# Altium schematic symbol library jlcpcb_2025_04_capacitors_extended_0805.schlib: 3281 symbols (part 9 of 18) (continued)
## CC0805JRX7R9BB681
designator C?  Capacitance: 680pF  (hidden comment: *)
Capacitor, Ceramic (MLCC), 680pF, ±5%, 50V, X7R, ±5%, SMD 0805; Manufacturer: YAGEO; Manufacturer Part Number: CC0805JRX7R9BB681; Package Size: 0805; JLCPCB Basic Part: No; JLCPCB Part Number: C520014; Supplier 1: LCSC; Category: Capacitors - MLCC; Supplier Part Number 1: C520014; Tolerance: ±5%; Voltage Rating: 50V; Temperature Coefficient: X7R; RoHS: Yes; ComponentLink1Description: Datasheet; ComponentLink1URL: https://wmsc.lcsc.com/wmsc/upload/file/pdf/v2/lcsc/2007231534_YAGEO-CC0805JRX7R9BB681_C520014.pdf; ComponentLink2Description: JLCPCB Part URL; ComponentLink2URL: https://jlcpcb.com/partdetail/C520014; ComponentLink3Description: LCSC Part URL; ComponentLink3URL: https://lcsc.com/product-detail/Multilayer-Ceramic-Capacitors-MLCC---SMD-SMT_YAGEO-YAGEO-CC0805JRX7R9BB681_C520014.html
footprint CAP-0805 (0805 (2012M) Capacitor)
pins: 1, 2

## CC0805JRX7R9BB682
designator C?  Capacitance: 6.8nF  (hidden comment: *)
Capacitor, Ceramic (MLCC), 6.8nF, ±5%, 50V, X7R, ±5%, SMD 0805; Manufacturer: YAGEO; Manufacturer Part Number: CC0805JRX7R9BB682; Package Size: 0805; JLCPCB Basic Part: No; JLCPCB Part Number: C520015; Supplier 1: LCSC; Category: Capacitors - MLCC; Supplier Part Number 1: C520015; Tolerance: ±5%; Voltage Rating: 50V; Temperature Coefficient: X7R; RoHS: Yes; ComponentLink1Description: Datasheet; ComponentLink1URL: https://wmsc.lcsc.com/wmsc/upload/file/pdf/v2/lcsc/2006011836_YAGEO-CC0805JRX7R9BB682_C520015.pdf; ComponentLink2Description: JLCPCB Part URL; ComponentLink2URL: https://jlcpcb.com/partdetail/C520015; ComponentLink3Description: LCSC Part URL; ComponentLink3URL: https://lcsc.com/product-detail/Multilayer-Ceramic-Capacitors-MLCC---SMD-SMT_YAGEO-YAGEO-CC0805JRX7R9BB682_C520015.html
footprint CAP-0805 (0805 (2012M) Capacitor)
pins: 1, 2

## CC0805JRX7R9BB683
designator C?  Capacitance: 68nF  (hidden comment: *)
Capacitor, Ceramic (MLCC), 68nF, ±5%, 50V, X7R, ±5%, SMD 0805; Manufacturer: YAGEO; Manufacturer Part Number: CC0805JRX7R9BB683; Package Size: 0805; JLCPCB Basic Part: No; JLCPCB Part Number: C520046; Supplier 1: LCSC; Category: Capacitors - MLCC; Supplier Part Number 1: C520046; Tolerance: ±5%; Voltage Rating: 50V; Temperature Coefficient: X7R; RoHS: Yes; ComponentLink1Description: Datasheet; ComponentLink1URL: https://wmsc.lcsc.com/wmsc/upload/file/pdf/v2/lcsc/2006011836_YAGEO-CC0805JRX7R9BB683_C520046.pdf; ComponentLink2Description: JLCPCB Part URL; ComponentLink2URL: https://jlcpcb.com/partdetail/C520046; ComponentLink3Description: LCSC Part URL; ComponentLink3URL: https://lcsc.com/product-detail/Multilayer-Ceramic-Capacitors-MLCC---SMD-SMT_YAGEO-YAGEO-CC0805JRX7R9BB683_C520046.html
footprint CAP-0805 (0805 (2012M) Capacitor)
pins: 1, 2

## CC0805JRX7R9BB821
designator C?  Capacitance: 820pF  (hidden comment: *)
Capacitor, Ceramic (MLCC), 820pF, ±5%, 50V, X7R, ±5%, SMD 0805; Manufacturer: YAGEO; Manufacturer Part Number: CC0805JRX7R9BB821; Package Size: 0805; JLCPCB Basic Part: No; JLCPCB Part Number: C520029; Supplier 1: LCSC; Category: Capacitors - MLCC; Supplier Part Number 1: C520029; Tolerance: ±5%; Voltage Rating: 50V; Temperature Coefficient: X7R; RoHS: Yes; ComponentLink1Description: Datasheet; ComponentLink1URL: https://wmsc.lcsc.com/wmsc/upload/file/pdf/v2/lcsc/2007231534_YAGEO-CC0805JRX7R9BB821_C520029.pdf; ComponentLink2Description: JLCPCB Part URL; ComponentLink2URL: https://jlcpcb.com/partdetail/C520029; ComponentLink3Description: LCSC Part URL; ComponentLink3URL: https://lcsc.com/product-detail/Multilayer-Ceramic-Capacitors-MLCC---SMD-SMT_YAGEO-YAGEO-CC0805JRX7R9BB821_C520029.html
footprint CAP-0805 (0805 (2012M) Capacitor)
pins: 1, 2

## CC0805JRX7R9BB822
designator C?  Capacitance: 8.2nF  (hidden comment: *)
Capacitor, Ceramic (MLCC), 8.2nF, ±5%, 50V, X7R, ±5%, SMD 0805; Manufacturer: YAGEO; Manufacturer Part Number: CC0805JRX7R9BB822; Package Size: 0805; JLCPCB Basic Part: No; JLCPCB Part Number: C309490; Supplier 1: LCSC; Category: Capacitors - MLCC; Supplier Part Number 1: C309490; Tolerance: ±5%; Voltage Rating: 50V; Temperature Coefficient: X7R; RoHS: Yes; ComponentLink1Description: Datasheet; ComponentLink1URL: https://wmsc.lcsc.com/wmsc/upload/file/pdf/v2/lcsc/2304140030_YAGEO-CC0805JRX7R9BB822_C309490.pdf; ComponentLink2Description: JLCPCB Part URL; ComponentLink2URL: https://jlcpcb.com/partdetail/C309490; ComponentLink3Description: LCSC Part URL; ComponentLink3URL: https://lcsc.com/product-detail/Multilayer-Ceramic-Capacitors-MLCC---SMD-SMT_YAGEO-YAGEO-CC0805JRX7R9BB822_C309490.html
footprint CAP-0805 (0805 (2012M) Capacitor)
pins: 1, 2

## CC0805JRX7R9BB823
designator C?  Capacitance: 82nF  (hidden comment: *)
Capacitor, Ceramic (MLCC), 82nF, ±5%, 50V, X7R, ±5%, SMD 0805; Manufacturer: YAGEO; Manufacturer Part Number: CC0805JRX7R9BB823; Package Size: 0805; JLCPCB Basic Part: No; JLCPCB Part Number: C520047; Supplier 1: LCSC; Category: Capacitors - MLCC; Supplier Part Number 1: C520047; Tolerance: ±5%; Voltage Rating: 50V; Temperature Coefficient: X7R; RoHS: Yes; ComponentLink1Description: Datasheet; ComponentLink1URL: https://wmsc.lcsc.com/wmsc/upload/file/pdf/v2/lcsc/2005141204_YAGEO-CC0805JRX7R9BB823_C520047.pdf; ComponentLink2Description: JLCPCB Part URL; ComponentLink2URL: https://jlcpcb.com/partdetail/C520047; ComponentLink3Description: LCSC Part URL; ComponentLink3URL: https://lcsc.com/product-detail/Multilayer-Ceramic-Capacitors-MLCC---SMD-SMT_YAGEO-YAGEO-CC0805JRX7R9BB823_C520047.html
footprint CAP-0805 (0805 (2012M) Capacitor)
pins: 1, 2

## CC0805JRX7RABB152
designator C?  Capacitance: 1.5nF  (hidden comment: *)
Capacitor, Ceramic (MLCC), 1.5nF, ±5%, 200V, X7R, ±5%, SMD 0805; Manufacturer: YAGEO; Manufacturer Part Number: CC0805JRX7RABB152; Package Size: 0805; JLCPCB Basic Part: No; JLCPCB Part Number: C1854493; Supplier 1: LCSC; Category: Capacitors - MLCC; Supplier Part Number 1: C1854493; Tolerance: ±5%; Voltage Rating: 200V; Temperature Coefficient: X7R; RoHS: Yes; ComponentLink1Description: Datasheet; ComponentLink1URL: https://wmsc.lcsc.com/wmsc/upload/file/pdf/v2/lcsc/2201271200_YAGEO-CC0805JRX7RABB152_C1854493.pdf; ComponentLink2Description: JLCPCB Part URL; ComponentLink2URL: https://jlcpcb.com/partdetail/C1854493; ComponentLink3Description: LCSC Part URL; ComponentLink3URL: https://lcsc.com/product-detail/Multilayer-Ceramic-Capacitors-MLCC---SMD-SMT_YAGEO-YAGEO-CC0805JRX7RABB152_C1854493.html
footprint CAP-0805 (0805 (2012M) Capacitor)
pins: 1, 2

## CC0805JRX7RABB221
designator C?  Capacitance: 220pF  (hidden comment: *)
Capacitor, Ceramic (MLCC), 220pF, ±5%, 200V, X7R, ±5%, SMD 0805; Manufacturer: YAGEO; Manufacturer Part Number: CC0805JRX7RABB221; Package Size: 0805; JLCPCB Basic Part: No; JLCPCB Part Number: C527220; Supplier 1: LCSC; Category: Capacitors - MLCC; Supplier Part Number 1: C527220; Tolerance: ±5%; Voltage Rating: 200V; Temperature Coefficient: X7R; RoHS: Yes; ComponentLink1Description: Datasheet; ComponentLink1URL: https://wmsc.lcsc.com/wmsc/upload/file/pdf/v2/lcsc/2005261832_YAGEO-CC0805JRX7RABB221_C527220.pdf; ComponentLink2Description: JLCPCB Part URL; ComponentLink2URL: https://jlcpcb.com/partdetail/C527220; ComponentLink3Description: LCSC Part URL; ComponentLink3URL: https://lcsc.com/product-detail/Multilayer-Ceramic-Capacitors-MLCC---SMD-SMT_YAGEO-YAGEO-CC0805JRX7RABB221_C527220.html
footprint CAP-0805 (0805 (2012M) Capacitor)
pins: 1, 2

## CC0805JRX7RABB331
designator C?  Capacitance: 330pF  (hidden comment: *)
Capacitor, Ceramic (MLCC), 330pF, ±5%, 200V, X7R, ±5%, SMD 0805; Manufacturer: YAGEO; Manufacturer Part Number: CC0805JRX7RABB331; Package Size: 0805; JLCPCB Basic Part: No; JLCPCB Part Number: C527221; Supplier 1: LCSC; Category: Capacitors - MLCC; Supplier Part Number 1: C527221; Tolerance: ±5%; Voltage Rating: 200V; Temperature Coefficient: X7R; RoHS: Yes; ComponentLink1Description: Datasheet; ComponentLink1URL: https://wmsc.lcsc.com/wmsc/upload/file/pdf/v2/lcsc/2006241834_YAGEO-CC0805JRX7RABB331_C527221.pdf; ComponentLink2Description: JLCPCB Part URL; ComponentLink2URL: https://jlcpcb.com/partdetail/C527221; ComponentLink3Description: LCSC Part URL; ComponentLink3URL: https://lcsc.com/product-detail/Multilayer-Ceramic-Capacitors-MLCC---SMD-SMT_YAGEO-YAGEO-CC0805JRX7RABB331_C527221.html
footprint CAP-0805 (0805 (2012M) Capacitor)
pins: 1, 2

## CC0805JRX7RABB332
designator C?  Capacitance: 3.3nF  (hidden comment: *)
Capacitor, Ceramic (MLCC), 3.3nF, ±5%, 200V, X7R, ±5%, SMD 0805; Manufacturer: YAGEO; Manufacturer Part Number: CC0805JRX7RABB332; Package Size: 0805; JLCPCB Basic Part: No; JLCPCB Part Number: C527222; Supplier 1: LCSC; Category: Capacitors - MLCC; Supplier Part Number 1: C527222; Tolerance: ±5%; Voltage Rating: 200V; Temperature Coefficient: X7R; RoHS: Yes; ComponentLink1Description: Datasheet; ComponentLink1URL: https://wmsc.lcsc.com/wmsc/upload/file/pdf/v2/lcsc/2007021836_YAGEO-CC0805JRX7RABB332_C527222.pdf; ComponentLink2Description: JLCPCB Part URL; ComponentLink2URL: https://jlcpcb.com/partdetail/C527222; ComponentLink3Description: LCSC Part URL; ComponentLink3URL: https://lcsc.com/product-detail/Multilayer-Ceramic-Capacitors-MLCC---SMD-SMT_YAGEO-YAGEO-CC0805JRX7RABB332_C527222.html
footprint CAP-0805 (0805 (2012M) Capacitor)
pins: 1, 2

## CC0805JRX7RABB471
designator C?  Capacitance: 470pF  (hidden comment: *)
Capacitor, Ceramic (MLCC), 470pF, ±5%, 200V, X7R, ±5%, SMD 0805; Manufacturer: YAGEO; Manufacturer Part Number: CC0805JRX7RABB471; Package Size: 0805; JLCPCB Basic Part: No; JLCPCB Part Number: C527223; Supplier 1: LCSC; Category: Capacitors - MLCC; Supplier Part Number 1: C527223; Tolerance: ±5%; Voltage Rating: 200V; Temperature Coefficient: X7R; RoHS: Yes; ComponentLink1Description: Datasheet; ComponentLink1URL: https://wmsc.lcsc.com/wmsc/upload/file/pdf/v2/lcsc/2006181535_YAGEO-CC0805JRX7RABB471_C527223.pdf; ComponentLink2Description: JLCPCB Part URL; ComponentLink2URL: https://jlcpcb.com/partdetail/C527223; ComponentLink3Description: LCSC Part URL; ComponentLink3URL: https://lcsc.com/product-detail/Multilayer-Ceramic-Capacitors-MLCC---SMD-SMT_YAGEO-YAGEO-CC0805JRX7RABB471_C527223.html
footprint CAP-0805 (0805 (2012M) Capacitor)
pins: 1, 2

## CC0805JRX7RABB472
designator C?  Capacitance: 4.7nF  (hidden comment: *)
Capacitor, Ceramic (MLCC), 4.7nF, ±5%, 200V, X7R, ±5%, SMD 0805; Manufacturer: YAGEO; Manufacturer Part Number: CC0805JRX7RABB472; Package Size: 0805; JLCPCB Basic Part: No; JLCPCB Part Number: C527224; Supplier 1: LCSC; Category: Capacitors - MLCC; Supplier Part Number 1: C527224; Tolerance: ±5%; Voltage Rating: 200V; Temperature Coefficient: X7R; RoHS: Yes; ComponentLink1Description: Datasheet; ComponentLink1URL: https://wmsc.lcsc.com/wmsc/upload/file/pdf/v2/lcsc/2007021836_YAGEO-CC0805JRX7RABB472_C527224.pdf; ComponentLink2Description: JLCPCB Part URL; ComponentLink2URL: https://jlcpcb.com/partdetail/C527224; ComponentLink3Description: LCSC Part URL; ComponentLink3URL: https://lcsc.com/product-detail/Multilayer-Ceramic-Capacitors-MLCC---SMD-SMT_YAGEO-YAGEO-CC0805JRX7RABB472_C527224.html
footprint CAP-0805 (0805 (2012M) Capacitor)
pins: 1, 2

## CC0805JRX7RYBB102
designator C?  Capacitance: 1nF  (hidden comment: *)
Capacitor, Ceramic (MLCC), 1nF, ±5%, 250V, X7R, ±5%, SMD 0805; Manufacturer: YAGEO; Manufacturer Part Number: CC0805JRX7RYBB102; Package Size: 0805; JLCPCB Basic Part: No; JLCPCB Part Number: C577000; Supplier 1: LCSC; Category: Capacitors - MLCC; Supplier Part Number 1: C577000; Tolerance: ±5%; Voltage Rating: 250V; Temperature Coefficient: X7R; RoHS: Yes; ComponentLink1Description: Datasheet; ComponentLink1URL: https://wmsc.lcsc.com/wmsc/upload/file/pdf/v2/lcsc/2206241815_YAGEO-CC0805JRX7RYBB102_C577000.pdf; ComponentLink2Description: JLCPCB Part URL; ComponentLink2URL: https://jlcpcb.com/partdetail/C577000; ComponentLink3Description: LCSC Part URL; ComponentLink3URL: https://lcsc.com/product-detail/Multilayer-Ceramic-Capacitors-MLCC---SMD-SMT_YAGEO-YAGEO-CC0805JRX7RYBB102_C577000.html
footprint CAP-0805 (0805 (2012M) Capacitor)
pins: 1, 2

## CC0805JRX7RYBB222
designator C?  Capacitance: 2.2nF  (hidden comment: *)
Capacitor, Ceramic (MLCC), 2.2nF, ±5%, 250V, X7R, ±5%, SMD 0805; Manufacturer: YAGEO; Manufacturer Part Number: CC0805JRX7RYBB222; Package Size: 0805; JLCPCB Basic Part: No; JLCPCB Part Number: C326832; Supplier 1: LCSC; Category: Capacitors - MLCC; Supplier Part Number 1: C326832; Tolerance: ±5%; Voltage Rating: 250V; Temperature Coefficient: X7R; RoHS: Yes; ComponentLink1Description: Datasheet; ComponentLink1URL: https://wmsc.lcsc.com/wmsc/upload/file/pdf/v2/lcsc/1811151646_YAGEO-CC0805JRX7RYBB222_C326832.pdf; ComponentLink2Description: JLCPCB Part URL; ComponentLink2URL: https://jlcpcb.com/partdetail/C326832; ComponentLink3Description: LCSC Part URL; ComponentLink3URL: https://lcsc.com/product-detail/Multilayer-Ceramic-Capacitors-MLCC---SMD-SMT_YAGEO-YAGEO-CC0805JRX7RYBB222_C326832.html
footprint CAP-0805 (0805 (2012M) Capacitor)
pins: 1, 2

## CC0805KKNPO9BN222
designator C?  Capacitance: 2.2nF  (hidden comment: *)
Capacitor, Ceramic (MLCC), 2.2nF, ±10%, 50V, NP0, ±10%, SMD 0805; Manufacturer: YAGEO; Manufacturer Part Number: CC0805KKNPO9BN222; Package Size: 0805; JLCPCB Basic Part: No; JLCPCB Part Number: C2174554; Supplier 1: LCSC; Category: Capacitors - MLCC; Supplier Part Number 1: C2174554; Tolerance: ±10%; Voltage Rating: 50V; Temperature Coefficient: NP0; RoHS: Yes; ComponentLink1Description: Datasheet; ComponentLink1URL: https://wmsc.lcsc.com/wmsc/upload/file/pdf/v2/lcsc/2202040700_YAGEO-CC0805KKNPO9BN222_C2174554.pdf; ComponentLink2Description: JLCPCB Part URL; ComponentLink2URL: https://jlcpcb.com/partdetail/C2174554; ComponentLink3Description: LCSC Part URL; ComponentLink3URL: https://lcsc.com/product-detail/Multilayer-Ceramic-Capacitors-MLCC---SMD-SMT_YAGEO-YAGEO-CC0805KKNPO9BN222_C2174554.html
footprint CAP-0805 (0805 (2012M) Capacitor)
pins: 1, 2

## CC0805KKX5R5BB105
designator C?  Capacitance: 1uF  (hidden comment: *)
Capacitor, Ceramic (MLCC), 1uF, ±10%, 6.3V, X5R, ±10%, SMD 0805; Manufacturer: YAGEO; Manufacturer Part Number: CC0805KKX5R5BB105; Package Size: 0805; JLCPCB Basic Part: No; JLCPCB Part Number: C519970; Supplier 1: LCSC; Category: Capacitors - MLCC; Supplier Part Number 1: C519970; Tolerance: ±10%; Voltage Rating: 6.3V; Temperature Coefficient: X5R; RoHS: Yes; ComponentLink1Description: Datasheet; ComponentLink1URL: https://wmsc.lcsc.com/wmsc/upload/file/pdf/v2/lcsc/2407081117_YAGEO-CC0805KKX5R5BB105_C519970.pdf; ComponentLink2Description: JLCPCB Part URL; ComponentLink2URL: https://jlcpcb.com/partdetail/C519970; ComponentLink3Description: LCSC Part URL; ComponentLink3URL: https://lcsc.com/product-detail/Multilayer-Ceramic-Capacitors-MLCC---SMD-SMT_YAGEO-YAGEO-CC0805KKX5R5BB105_C519970.html
footprint CAP-0805 (0805 (2012M) Capacitor)
pins: 1, 2

## CC0805KKX5R5BB106
designator C?  Capacitance: 10uF  (hidden comment: *)
Capacitor, Ceramic (MLCC), 10uF, ±10%, 6.3V, X5R, ±10%, SMD 0805; Manufacturer: YAGEO; Manufacturer Part Number: CC0805KKX5R5BB106; Package Size: 0805; JLCPCB Basic Part: No; JLCPCB Part Number: C577001; Supplier 1: LCSC; Category: Capacitors - MLCC; Supplier Part Number 1: C577001; Tolerance: ±10%; Voltage Rating: 6.3V; Temperature Coefficient: X5R; RoHS: Yes; ComponentLink1Description: Datasheet; ComponentLink1URL: https://wmsc.lcsc.com/wmsc/upload/file/pdf/v2/lcsc/2407081117_YAGEO-CC0805KKX5R5BB106_C577001.pdf; ComponentLink2Description: JLCPCB Part URL; ComponentLink2URL: https://jlcpcb.com/partdetail/C577001; ComponentLink3Description: LCSC Part URL; ComponentLink3URL: https://lcsc.com/product-detail/Multilayer-Ceramic-Capacitors-MLCC---SMD-SMT_YAGEO-YAGEO-CC0805KKX5R5BB106_C577001.html
footprint CAP-0805 (0805 (2012M) Capacitor)
pins: 1, 2

## CC0805KKX5R5BB225
designator C?  Capacitance: 2.2uF  (hidden comment: *)
Capacitor, Ceramic (MLCC), 2.2uF, ±10%, 6.3V, X5R, ±10%, SMD 0805; Manufacturer: YAGEO; Manufacturer Part Number: CC0805KKX5R5BB225; Package Size: 0805; JLCPCB Basic Part: No; JLCPCB Part Number: C520033; Supplier 1: LCSC; Category: Capacitors - MLCC; Supplier Part Number 1: C520033; Tolerance: ±10%; Voltage Rating: 6.3V; Temperature Coefficient: X5R; RoHS: Yes; ComponentLink1Description: Datasheet; ComponentLink1URL: https://wmsc.lcsc.com/wmsc/upload/file/pdf/v2/lcsc/2407081117_YAGEO-CC0805KKX5R5BB225_C520033.pdf; ComponentLink2Description: JLCPCB Part URL; ComponentLink2URL: https://jlcpcb.com/partdetail/C520033; ComponentLink3Description: LCSC Part URL; ComponentLink3URL: https://lcsc.com/product-detail/Multilayer-Ceramic-Capacitors-MLCC---SMD-SMT_YAGEO-YAGEO-CC0805KKX5R5BB225_C520033.html
footprint CAP-0805 (0805 (2012M) Capacitor)
pins: 1, 2

## CC0805KKX5R5BB226
designator C?  Capacitance: 22uF  (hidden comment: *)
Capacitor, Ceramic (MLCC), 22uF, ±10%, 6.3V, X5R, ±10%, SMD 0805; Manufacturer: YAGEO; Manufacturer Part Number: CC0805KKX5R5BB226; Package Size: 0805; JLCPCB Basic Part: No; JLCPCB Part Number: C326578; Supplier 1: LCSC; Category: Capacitors - MLCC; Supplier Part Number 1: C326578; Tolerance: ±10%; Voltage Rating: 6.3V; Temperature Coefficient: X5R; RoHS: Yes; ComponentLink1Description: Datasheet; ComponentLink1URL: https://wmsc.lcsc.com/wmsc/upload/file/pdf/v2/lcsc/2407081117_YAGEO-CC0805KKX5R5BB226_C326578.pdf; ComponentLink2Description: JLCPCB Part URL; ComponentLink2URL: https://jlcpcb.com/partdetail/C326578; ComponentLink3Description: LCSC Part URL; ComponentLink3URL: https://lcsc.com/product-detail/Multilayer-Ceramic-Capacitors-MLCC---SMD-SMT_YAGEO-YAGEO-CC0805KKX5R5BB226_C326578.html
footprint CAP-0805 (0805 (2012M) Capacitor)
pins: 1, 2

## CC0805KKX5R5BB475
designator C?  Capacitance: 4.7uF  (hidden comment: *)
Capacitor, Ceramic (MLCC), 4.7uF, ±10%, 6.3V, X5R, ±10%, SMD 0805; Manufacturer: YAGEO; Manufacturer Part Number: CC0805KKX5R5BB475; Package Size: 0805; JLCPCB Basic Part: No; JLCPCB Part Number: C107124; Supplier 1: LCSC; Category: Capacitors - MLCC; Supplier Part Number 1: C107124; Tolerance: ±10%; Voltage Rating: 6.3V; Temperature Coefficient: X5R; RoHS: Yes; ComponentLink1Description: Datasheet; ComponentLink1URL: https://wmsc.lcsc.com/wmsc/upload/file/pdf/v2/lcsc/2407081117_YAGEO-CC0805KKX5R5BB475_C107124.pdf; ComponentLink2Description: JLCPCB Part URL; ComponentLink2URL: https://jlcpcb.com/partdetail/C107124; ComponentLink3Description: LCSC Part URL; ComponentLink3URL: https://lcsc.com/product-detail/Multilayer-Ceramic-Capacitors-MLCC---SMD-SMT_YAGEO-YAGEO-CC0805KKX5R5BB475_C107124.html
footprint CAP-0805 (0805 (2012M) Capacitor)
pins: 1, 2

## CC0805KKX5R6BB105
designator C?  Capacitance: 1uF  (hidden comment: *)
Capacitor, Ceramic (MLCC), 1uF, ±10%, 10V, X5R, ±10%, SMD 0805; Manufacturer: YAGEO; Manufacturer Part Number: CC0805KKX5R6BB105; Package Size: 0805; JLCPCB Basic Part: No; JLCPCB Part Number: C408907; Supplier 1: LCSC; Category: Capacitors - MLCC; Supplier Part Number 1: C408907; Tolerance: ±10%; Voltage Rating: 10V; Temperature Coefficient: X5R; RoHS: Yes; ComponentLink1Description: Datasheet; ComponentLink1URL: https://wmsc.lcsc.com/wmsc/upload/file/pdf/v2/lcsc/2407081117_YAGEO-CC0805KKX5R6BB105_C408907.pdf; ComponentLink2Description: JLCPCB Part URL; ComponentLink2URL: https://jlcpcb.com/partdetail/C408907; ComponentLink3Description: LCSC Part URL; ComponentLink3URL: https://lcsc.com/product-detail/Multilayer-Ceramic-Capacitors-MLCC---SMD-SMT_YAGEO-YAGEO-CC0805KKX5R6BB105_C408907.html
footprint CAP-0805 (0805 (2012M) Capacitor)
pins: 1, 2

## CC0805KKX5R6BB106
designator C?  Capacitance: 10uF  (hidden comment: *)
Capacitor, Ceramic (MLCC), 10uF, ±10%, 10V, X5R, ±10%, SMD 0805; Manufacturer: YAGEO; Manufacturer Part Number: CC0805KKX5R6BB106; Package Size: 0805; JLCPCB Basic Part: No; JLCPCB Part Number: C89832; Supplier 1: LCSC; Category: Capacitors - MLCC; Supplier Part Number 1: C89832; Tolerance: ±10%; Voltage Rating: 10V; Temperature Coefficient: X5R; RoHS: Yes; ComponentLink1Description: Datasheet; ComponentLink1URL: https://wmsc.lcsc.com/wmsc/upload/file/pdf/v2/lcsc/2407081117_YAGEO-CC0805KKX5R6BB106_C89832.pdf; ComponentLink2Description: JLCPCB Part URL; ComponentLink2URL: https://jlcpcb.com/partdetail/C89832; ComponentLink3Description: LCSC Part URL; ComponentLink3URL: https://lcsc.com/product-detail/Multilayer-Ceramic-Capacitors-MLCC---SMD-SMT_YAGEO-YAGEO-CC0805KKX5R6BB106_C89832.html
footprint CAP-0805 (0805 (2012M) Capacitor)
pins: 1, 2

## CC0805KKX5R6BB225
designator C?  Capacitance: 2.2uF  (hidden comment: *)
Capacitor, Ceramic (MLCC), 2.2uF, ±10%, 10V, X5R, ±10%, SMD 0805; Manufacturer: YAGEO; Manufacturer Part Number: CC0805KKX5R6BB225; Package Size: 0805; JLCPCB Basic Part: No; JLCPCB Part Number: C327027; Supplier 1: LCSC; Category: Capacitors - MLCC; Supplier Part Number 1: C327027; Tolerance: ±10%; Voltage Rating: 10V; Temperature Coefficient: X5R; RoHS: Yes; ComponentLink1Description: Datasheet; ComponentLink1URL: https://wmsc.lcsc.com/wmsc/upload/file/pdf/v2/lcsc/2407081117_YAGEO-CC0805KKX5R6BB225_C327027.pdf; ComponentLink2Description: JLCPCB Part URL; ComponentLink2URL: https://jlcpcb.com/partdetail/C327027; ComponentLink3Description: LCSC Part URL; ComponentLink3URL: https://lcsc.com/product-detail/Multilayer-Ceramic-Capacitors-MLCC---SMD-SMT_YAGEO-YAGEO-CC0805KKX5R6BB225_C327027.html
footprint CAP-0805 (0805 (2012M) Capacitor)
pins: 1, 2

## CC0805KKX5R6BB475
designator C?  Capacitance: 4.7uF  (hidden comment: *)
Capacitor, Ceramic (MLCC), 4.7uF, ±10%, 10V, X5R, ±10%, SMD 0805; Manufacturer: YAGEO; Manufacturer Part Number: CC0805KKX5R6BB475; Package Size: 0805; JLCPCB Basic Part: No; JLCPCB Part Number: C107125; Supplier 1: LCSC; Category: Capacitors - MLCC; Supplier Part Number 1: C107125; Tolerance: ±10%; Voltage Rating: 10V; Temperature Coefficient: X5R; RoHS: Yes; ComponentLink1Description: Datasheet; ComponentLink1URL: https://wmsc.lcsc.com/wmsc/upload/file/pdf/v2/lcsc/2407081117_YAGEO-CC0805KKX5R6BB475_C107125.pdf; ComponentLink2Description: JLCPCB Part URL; ComponentLink2URL: https://jlcpcb.com/partdetail/C107125; ComponentLink3Description: LCSC Part URL; ComponentLink3URL: https://lcsc.com/product-detail/Multilayer-Ceramic-Capacitors-MLCC---SMD-SMT_YAGEO-YAGEO-CC0805KKX5R6BB475_C107125.html
footprint CAP-0805 (0805 (2012M) Capacitor)
pins: 1, 2

## CC0805KKX5R7BB105
designator C?  Capacitance: 1uF  (hidden comment: *)
Capacitor, Ceramic (MLCC), 1uF, ±10%, 16V, X5R, ±10%, SMD 0805; Manufacturer: YAGEO; Manufacturer Part Number: CC0805KKX5R7BB105; Package Size: 0805; JLCPCB Basic Part: No; JLCPCB Part Number: C519971; Supplier 1: LCSC; Category: Capacitors - MLCC; Supplier Part Number 1: C519971; Tolerance: ±10%; Voltage Rating: 16V; Temperature Coefficient: X5R; RoHS: Yes; ComponentLink1Description: Datasheet; ComponentLink1URL: https://wmsc.lcsc.com/wmsc/upload/file/pdf/v2/lcsc/2407081117_YAGEO-CC0805KKX5R7BB105_C519971.pdf; ComponentLink2Description: JLCPCB Part URL; ComponentLink2URL: https://jlcpcb.com/partdetail/C519971; ComponentLink3Description: LCSC Part URL; ComponentLink3URL: https://lcsc.com/product-detail/Multilayer-Ceramic-Capacitors-MLCC---SMD-SMT_YAGEO-YAGEO-CC0805KKX5R7BB105_C519971.html
footprint CAP-0805 (0805 (2012M) Capacitor)
pins: 1, 2

## CC0805KKX5R7BB106
designator C?  Capacitance: 10uF  (hidden comment: *)
Capacitor, Ceramic (MLCC), 10uF, ±10%, 16V, X5R, ±10%, SMD 0805; Manufacturer: YAGEO; Manufacturer Part Number: CC0805KKX5R7BB106; Package Size: 0805; JLCPCB Basic Part: No; JLCPCB Part Number: C89827; Supplier 1: LCSC; Category: Capacitors - MLCC; Supplier Part Number 1: C89827; Tolerance: ±10%; Voltage Rating: 16V; Temperature Coefficient: X5R; RoHS: Yes; ComponentLink1Description: Datasheet; ComponentLink1URL: https://wmsc.lcsc.com/wmsc/upload/file/pdf/v2/lcsc/2407081117_YAGEO-CC0805KKX5R7BB106_C89827.pdf; ComponentLink2Description: JLCPCB Part URL; ComponentLink2URL: https://jlcpcb.com/partdetail/C89827; ComponentLink3Description: LCSC Part URL; ComponentLink3URL: https://lcsc.com/product-detail/Multilayer-Ceramic-Capacitors-MLCC---SMD-SMT_YAGEO-YAGEO-CC0805KKX5R7BB106_C89827.html
footprint CAP-0805 (0805 (2012M) Capacitor)
pins: 1, 2

## CC0805KKX5R7BB225
designator C?  Capacitance: 2.2uF  (hidden comment: *)
Capacitor, Ceramic (MLCC), 2.2uF, ±10%, 16V, X5R, ±10%, SMD 0805; Manufacturer: YAGEO; Manufacturer Part Number: CC0805KKX5R7BB225; Package Size: 0805; JLCPCB Basic Part: No; JLCPCB Part Number: C113841; Supplier 1: LCSC; Category: Capacitors - MLCC; Supplier Part Number 1: C113841; Tolerance: ±10%; Voltage Rating: 16V; Temperature Coefficient: X5R; RoHS: Yes; ComponentLink1Description: Datasheet; ComponentLink1URL: https://wmsc.lcsc.com/wmsc/upload/file/pdf/v2/lcsc/2407081117_YAGEO-CC0805KKX5R7BB225_C113841.pdf; ComponentLink2Description: JLCPCB Part URL; ComponentLink2URL: https://jlcpcb.com/partdetail/C113841; ComponentLink3Description: LCSC Part URL; ComponentLink3URL: https://lcsc.com/product-detail/Multilayer-Ceramic-Capacitors-MLCC---SMD-SMT_YAGEO-YAGEO-CC0805KKX5R7BB225_C113841.html
footprint CAP-0805 (0805 (2012M) Capacitor)
pins: 1, 2

## CC0805KKX5R7BB475
designator C?  Capacitance: 4.7uF  (hidden comment: *)
Capacitor, Ceramic (MLCC), 4.7uF, ±10%, 16V, X5R, ±10%, SMD 0805; Manufacturer: YAGEO; Manufacturer Part Number: CC0805KKX5R7BB475; Package Size: 0805; JLCPCB Basic Part: No; JLCPCB Part Number: C132176; Supplier 1: LCSC; Category: Capacitors - MLCC; Supplier Part Number 1: C132176; Tolerance: ±10%; Voltage Rating: 16V; Temperature Coefficient: X5R; RoHS: Yes; ComponentLink1Description: Datasheet; ComponentLink1URL: https://wmsc.lcsc.com/wmsc/upload/file/pdf/v2/lcsc/2407081117_YAGEO-CC0805KKX5R7BB475_C132176.pdf; ComponentLink2Description: JLCPCB Part URL; ComponentLink2URL: https://jlcpcb.com/partdetail/C132176; ComponentLink3Description: LCSC Part URL; ComponentLink3URL: https://lcsc.com/product-detail/Multilayer-Ceramic-Capacitors-MLCC---SMD-SMT_YAGEO-YAGEO-CC0805KKX5R7BB475_C132176.html
footprint CAP-0805 (0805 (2012M) Capacitor)
pins: 1, 2

## CC0805KKX5R8BB105
designator C?  Capacitance: 1uF  (hidden comment: *)
Capacitor, Ceramic (MLCC), 1uF, ±10%, 25V, X5R, ±10%, SMD 0805; Manufacturer: YAGEO; Manufacturer Part Number: CC0805KKX5R8BB105; Package Size: 0805; JLCPCB Basic Part: No; JLCPCB Part Number: C408908; Supplier 1: LCSC; Category: Capacitors - MLCC; Supplier Part Number 1: C408908; Tolerance: ±10%; Voltage Rating: 25V; Temperature Coefficient: X5R; RoHS: Yes; ComponentLink1Description: Datasheet; ComponentLink1URL: https://wmsc.lcsc.com/wmsc/upload/file/pdf/v2/lcsc/2407081117_YAGEO-CC0805KKX5R8BB105_C408908.pdf; ComponentLink2Description: JLCPCB Part URL; ComponentLink2URL: https://jlcpcb.com/partdetail/C408908; ComponentLink3Description: LCSC Part URL; ComponentLink3URL: https://lcsc.com/product-detail/Multilayer-Ceramic-Capacitors-MLCC---SMD-SMT_YAGEO-YAGEO-CC0805KKX5R8BB105_C408908.html
footprint CAP-0805 (0805 (2012M) Capacitor)
pins: 1, 2

## CC0805KKX5R8BB106
designator C?  Capacitance: 10uF  (hidden comment: *)
Capacitor, Ceramic (MLCC), 10uF, ±10%, 25V, X5R, ±10%, SMD 0805; Manufacturer: YAGEO; Manufacturer Part Number: CC0805KKX5R8BB106; Package Size: 0805; JLCPCB Basic Part: No; JLCPCB Part Number: C89831; Supplier 1: LCSC; Category: Capacitors - MLCC; Supplier Part Number 1: C89831; Tolerance: ±10%; Voltage Rating: 25V; Temperature Coefficient: X5R; RoHS: Yes; ComponentLink1Description: Datasheet; ComponentLink1URL: https://wmsc.lcsc.com/wmsc/upload/file/pdf/v2/lcsc/2407081117_YAGEO-CC0805KKX5R8BB106_C89831.pdf; ComponentLink2Description: JLCPCB Part URL; ComponentLink2URL: https://jlcpcb.com/partdetail/C89831; ComponentLink3Description: LCSC Part URL; ComponentLink3URL: https://lcsc.com/product-detail/Multilayer-Ceramic-Capacitors-MLCC---SMD-SMT_YAGEO-YAGEO-CC0805KKX5R8BB106_C89831.html
footprint CAP-0805 (0805 (2012M) Capacitor)
pins: 1, 2

## CC0805KKX5R8BB225
designator C?  Capacitance: 2.2uF  (hidden comment: *)
Capacitor, Ceramic (MLCC), 2.2uF, ±10%, 25V, X5R, ±10%, SMD 0805; Manufacturer: YAGEO; Manufacturer Part Number: CC0805KKX5R8BB225; Package Size: 0805; JLCPCB Basic Part: No; JLCPCB Part Number: C277526; Supplier 1: LCSC; Category: Capacitors - MLCC; Supplier Part Number 1: C277526; Tolerance: ±10%; Voltage Rating: 25V; Temperature Coefficient: X5R; RoHS: Yes; ComponentLink1Description: Datasheet; ComponentLink1URL: https://wmsc.lcsc.com/wmsc/upload/file/pdf/v2/lcsc/2407081117_YAGEO-CC0805KKX5R8BB225_C277526.pdf; ComponentLink2Description: JLCPCB Part URL; ComponentLink2URL: https://jlcpcb.com/partdetail/C277526; ComponentLink3Description: LCSC Part URL; ComponentLink3URL: https://lcsc.com/product-detail/Multilayer-Ceramic-Capacitors-MLCC---SMD-SMT_YAGEO-YAGEO-CC0805KKX5R8BB225_C277526.html
footprint CAP-0805 (0805 (2012M) Capacitor)
pins: 1, 2

## CC0805KKX5R8BB475
designator C?  Capacitance: 4.7uF  (hidden comment: *)
Capacitor, Ceramic (MLCC), 4.7uF, ±10%, 25V, X5R, ±10%, SMD 0805; Manufacturer: YAGEO; Manufacturer Part Number: CC0805KKX5R8BB475; Package Size: 0805; JLCPCB Basic Part: No; JLCPCB Part Number: C132173; Supplier 1: LCSC; Category: Capacitors - MLCC; Supplier Part Number 1: C132173; Tolerance: ±10%; Voltage Rating: 25V; Temperature Coefficient: X5R; RoHS: Yes; ComponentLink1Description: Datasheet; ComponentLink1URL: https://wmsc.lcsc.com/wmsc/upload/file/pdf/v2/lcsc/2407081117_YAGEO-CC0805KKX5R8BB475_C132173.pdf; ComponentLink2Description: JLCPCB Part URL; ComponentLink2URL: https://jlcpcb.com/partdetail/C132173; ComponentLink3Description: LCSC Part URL; ComponentLink3URL: https://lcsc.com/product-detail/Multilayer-Ceramic-Capacitors-MLCC---SMD-SMT_YAGEO-YAGEO-CC0805KKX5R8BB475_C132173.html
footprint CAP-0805 (0805 (2012M) Capacitor)
pins: 1, 2

## CC0805KKX5R9BB105
designator C?  Capacitance: 1uF  (hidden comment: *)
Capacitor, Ceramic (MLCC), 1uF, ±10%, 50V, X5R, ±10%, SMD 0805; Manufacturer: YAGEO; Manufacturer Part Number: CC0805KKX5R9BB105; Package Size: 0805; JLCPCB Basic Part: No; JLCPCB Part Number: C519978; Supplier 1: LCSC; Category: Capacitors - MLCC; Supplier Part Number 1: C519978; Tolerance: ±10%; Voltage Rating: 50V; Temperature Coefficient: X5R; RoHS: Yes; ComponentLink1Description: Datasheet; ComponentLink1URL: https://wmsc.lcsc.com/wmsc/upload/file/pdf/v2/lcsc/2407081117_YAGEO-CC0805KKX5R9BB105_C519978.pdf; ComponentLink2Description: JLCPCB Part URL; ComponentLink2URL: https://jlcpcb.com/partdetail/C519978; ComponentLink3Description: LCSC Part URL; ComponentLink3URL: https://lcsc.com/product-detail/Multilayer-Ceramic-Capacitors-MLCC---SMD-SMT_YAGEO-YAGEO-CC0805KKX5R9BB105_C519978.html
footprint CAP-0805 (0805 (2012M) Capacitor)
pins: 1, 2

## CC0805KKX5R9BB225
designator C?  Capacitance: 2.2uF  (hidden comment: *)
Capacitor, Ceramic (MLCC), 2.2uF, ±10%, 50V, X5R, ±10%, SMD 0805; Manufacturer: YAGEO; Manufacturer Part Number: CC0805KKX5R9BB225; Package Size: 0805; JLCPCB Basic Part: No; JLCPCB Part Number: C326581; Supplier 1: LCSC; Category: Capacitors - MLCC; Supplier Part Number 1: C326581; Tolerance: ±10%; Voltage Rating: 50V; Temperature Coefficient: X5R; RoHS: Yes; ComponentLink1Description: Datasheet; ComponentLink1URL: https://wmsc.lcsc.com/wmsc/upload/file/pdf/v2/lcsc/2407081117_YAGEO-CC0805KKX5R9BB225_C326581.pdf; ComponentLink2Description: JLCPCB Part URL; ComponentLink2URL: https://jlcpcb.com/partdetail/C326581; ComponentLink3Description: LCSC Part URL; ComponentLink3URL: https://lcsc.com/product-detail/Multilayer-Ceramic-Capacitors-MLCC---SMD-SMT_YAGEO-YAGEO-CC0805KKX5R9BB225_C326581.html
footprint CAP-0805 (0805 (2012M) Capacitor)
pins: 1, 2

## CC0805KKX5R9BB475
designator C?  Capacitance: 4.7uF  (hidden comment: *)
Capacitor, Ceramic (MLCC), 4.7uF, ±10%, 50V, X5R, ±10%, SMD 0805; Manufacturer: YAGEO; Manufacturer Part Number: CC0805KKX5R9BB475; Package Size: 0805; JLCPCB Basic Part: No; JLCPCB Part Number: C2897302; Supplier 1: LCSC; Category: Capacitors - MLCC; Supplier Part Number 1: C2897302; Tolerance: ±10%; Voltage Rating: 50V; Temperature Coefficient: X5R; RoHS: Yes; ComponentLink1Description: Datasheet; ComponentLink1URL: https://wmsc.lcsc.com/wmsc/upload/file/pdf/v2/lcsc/2407081117_YAGEO-CC0805KKX5R9BB475_C2897302.pdf; ComponentLink2Description: JLCPCB Part URL; ComponentLink2URL: https://jlcpcb.com/partdetail/C2897302; ComponentLink3Description: LCSC Part URL; ComponentLink3URL: https://lcsc.com/product-detail/Multilayer-Ceramic-Capacitors-MLCC---SMD-SMT_YAGEO-YAGEO-CC0805KKX5R9BB475_C2897302.html
footprint CAP-0805 (0805 (2012M) Capacitor)
pins: 1, 2

## CC0805KKX7R0BB104
designator C?  Capacitance: 100nF  (hidden comment: *)
Capacitor, Ceramic (MLCC), 100nF, ±10%, 100V, X7R, ±10%, SMD 0805; Manufacturer: YAGEO; Manufacturer Part Number: CC0805KKX7R0BB104; Package Size: 0805; JLCPCB Basic Part: No; JLCPCB Part Number: C106243; Supplier 1: LCSC; Category: Capacitors - MLCC; Supplier Part Number 1: C106243; Tolerance: ±10%; Voltage Rating: 100V; Temperature Coefficient: X7R; RoHS: Yes; ComponentLink1Description: Datasheet; ComponentLink1URL: https://wmsc.lcsc.com/wmsc/upload/file/pdf/v2/lcsc/1810311438_YAGEO-CC0805KKX7R0BB104_C106243.pdf; ComponentLink2Description: JLCPCB Part URL; ComponentLink2URL: https://jlcpcb.com/partdetail/C106243; ComponentLink3Description: LCSC Part URL; ComponentLink3URL: https://lcsc.com/product-detail/Multilayer-Ceramic-Capacitors-MLCC---SMD-SMT_YAGEO-YAGEO-CC0805KKX7R0BB104_C106243.html
footprint CAP-0805 (0805 (2012M) Capacitor)
pins: 1, 2

## CC0805KKX7R0BB105
designator C?  Capacitance: 1uF  (hidden comment: *)
Capacitor, Ceramic (MLCC), 1uF, ±10%, 100V, X7R, ±10%, SMD 0805; Manufacturer: YAGEO; Manufacturer Part Number: CC0805KKX7R0BB105; Package Size: 0805; JLCPCB Basic Part: No; JLCPCB Part Number: C5370002; Supplier 1: LCSC; Category: Capacitors - MLCC; Supplier Part Number 1: C5370002; Tolerance: ±10%; Voltage Rating: 100V; Temperature Coefficient: X7R; RoHS: Yes; ComponentLink1Description: Datasheet; ComponentLink1URL: https://wmsc.lcsc.com/wmsc/upload/file/pdf/v2/lcsc/2404081803_YAGEO-CC0805KKX7R0BB105_C5370002.pdf; ComponentLink2Description: JLCPCB Part URL; ComponentLink2URL: https://jlcpcb.com/partdetail/C5370002; ComponentLink3Description: LCSC Part URL; ComponentLink3URL: https://lcsc.com/product-detail/Multilayer-Ceramic-Capacitors-MLCC---SMD-SMT_YAGEO-YAGEO-CC0805KKX7R0BB105_C5370002.html
footprint CAP-0805 (0805 (2012M) Capacitor)
pins: 1, 2

## CC0805KKX7R0BB224
designator C?  Capacitance: 220nF  (hidden comment: *)
Capacitor, Ceramic (MLCC), 220nF, ±10%, 100V, X7R, ±10%, SMD 0805; Manufacturer: YAGEO; Manufacturer Part Number: CC0805KKX7R0BB224; Package Size: 0805; JLCPCB Basic Part: No; JLCPCB Part Number: C513710; Supplier 1: LCSC; Category: Capacitors - MLCC; Supplier Part Number 1: C513710; Tolerance: ±10%; Voltage Rating: 100V; Temperature Coefficient: X7R; RoHS: Yes; ComponentLink1Description: Datasheet; ComponentLink1URL: https://wmsc.lcsc.com/wmsc/upload/file/pdf/v2/lcsc/2004231434_YAGEO-CC0805KKX7R0BB224_C513710.pdf; ComponentLink2Description: JLCPCB Part URL; ComponentLink2URL: https://jlcpcb.com/partdetail/C513710; ComponentLink3Description: LCSC Part URL; ComponentLink3URL: https://lcsc.com/product-detail/Multilayer-Ceramic-Capacitors-MLCC---SMD-SMT_YAGEO-YAGEO-CC0805KKX7R0BB224_C513710.html
footprint CAP-0805 (0805 (2012M) Capacitor)
pins: 1, 2

## CC0805KKX7R0BB333
designator C?  Capacitance: 33nF  (hidden comment: *)
Capacitor, Ceramic (MLCC), 33nF, ±10%, 100V, X7R, ±10%, SMD 0805; Manufacturer: YAGEO; Manufacturer Part Number: CC0805KKX7R0BB333; Package Size: 0805; JLCPCB Basic Part: No; JLCPCB Part Number: C327114; Supplier 1: LCSC; Category: Capacitors - MLCC; Supplier Part Number 1: C327114; Tolerance: ±10%; Voltage Rating: 100V; Temperature Coefficient: X7R; RoHS: Yes; ComponentLink1Description: Datasheet; ComponentLink1URL: https://wmsc.lcsc.com/wmsc/upload/file/pdf/v2/lcsc/1811141233_YAGEO-CC0805KKX7R0BB333_C327114.pdf; ComponentLink2Description: JLCPCB Part URL; ComponentLink2URL: https://jlcpcb.com/partdetail/C327114; ComponentLink3Description: LCSC Part URL; ComponentLink3URL: https://lcsc.com/product-detail/Multilayer-Ceramic-Capacitors-MLCC---SMD-SMT_YAGEO-YAGEO-CC0805KKX7R0BB333_C327114.html
footprint CAP-0805 (0805 (2012M) Capacitor)
pins: 1, 2

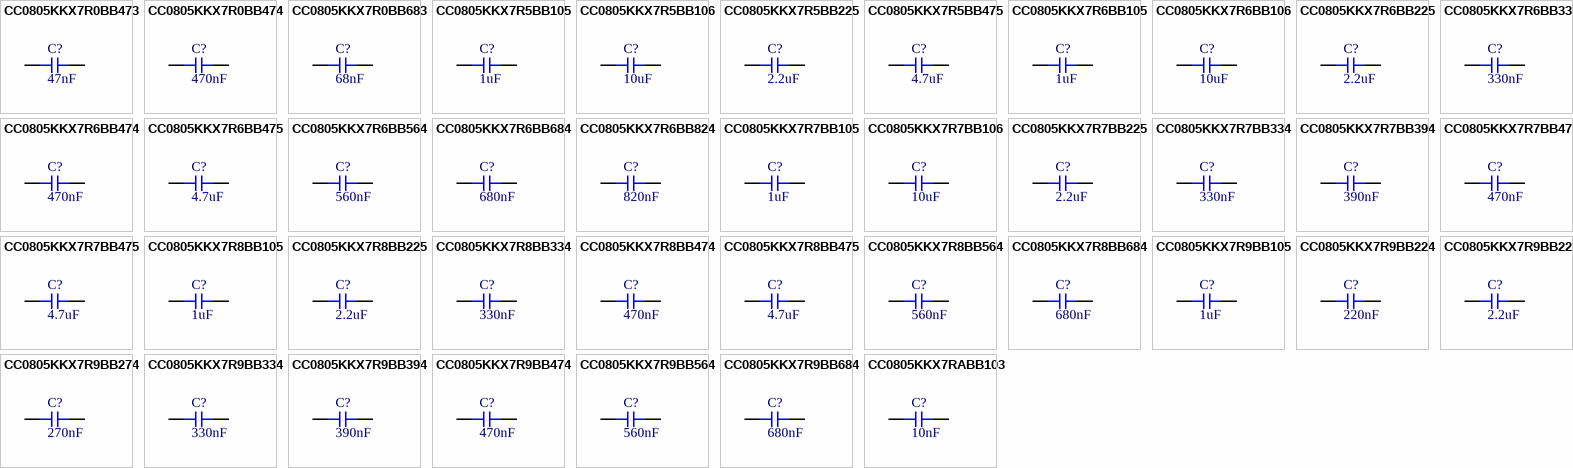
[diagram p40: symbols CC0805KKX7R0BB473 to CC0805KKX7RABB103]

## CC0805KKX7R0BB473
designator C?  Capacitance: 47nF  (hidden comment: *)
Capacitor, Ceramic (MLCC), 47nF, ±10%, 100V, X7R, ±10%, SMD 0805; Manufacturer: YAGEO; Manufacturer Part Number: CC0805KKX7R0BB473; Package Size: 0805; JLCPCB Basic Part: No; JLCPCB Part Number: C107126; Supplier 1: LCSC; Category: Capacitors - MLCC; Supplier Part Number 1: C107126; Tolerance: ±10%; Voltage Rating: 100V; Temperature Coefficient: X7R; RoHS: Yes; ComponentLink1Description: Datasheet; ComponentLink1URL: https://wmsc.lcsc.com/wmsc/upload/file/pdf/v2/lcsc/2304140030_YAGEO-CC0805KKX7R0BB473_C107126.pdf; ComponentLink2Description: JLCPCB Part URL; ComponentLink2URL: https://jlcpcb.com/partdetail/C107126; ComponentLink3Description: LCSC Part URL; ComponentLink3URL: https://lcsc.com/product-detail/Multilayer-Ceramic-Capacitors-MLCC---SMD-SMT_YAGEO-YAGEO-CC0805KKX7R0BB473_C107126.html
footprint CAP-0805 (0805 (2012M) Capacitor)
pins: 1, 2

## CC0805KKX7R0BB474
designator C?  Capacitance: 470nF  (hidden comment: *)
Capacitor, Ceramic (MLCC), 470nF, ±10%, 100V, X7R, ±10%, SMD 0805; Manufacturer: YAGEO; Manufacturer Part Number: CC0805KKX7R0BB474; Package Size: 0805; JLCPCB Basic Part: No; JLCPCB Part Number: C596323; Supplier 1: LCSC; Category: Capacitors - MLCC; Supplier Part Number 1: C596323; Tolerance: ±10%; Voltage Rating: 100V; Temperature Coefficient: X7R; RoHS: Yes; ComponentLink1Description: Datasheet; ComponentLink1URL: https://wmsc.lcsc.com/wmsc/upload/file/pdf/v2/lcsc/2006091815_YAGEO-CC0805KKX7R0BB474_C596323.pdf; ComponentLink2Description: JLCPCB Part URL; ComponentLink2URL: https://jlcpcb.com/partdetail/C596323; ComponentLink3Description: LCSC Part URL; ComponentLink3URL: https://lcsc.com/product-detail/Multilayer-Ceramic-Capacitors-MLCC---SMD-SMT_YAGEO-YAGEO-CC0805KKX7R0BB474_C596323.html
footprint CAP-0805 (0805 (2012M) Capacitor)
pins: 1, 2

## CC0805KKX7R0BB683
designator C?  Capacitance: 68nF  (hidden comment: *)
Capacitor, Ceramic (MLCC), 68nF, ±10%, 100V, X7R, ±10%, SMD 0805; Manufacturer: YAGEO; Manufacturer Part Number: CC0805KKX7R0BB683; Package Size: 0805; JLCPCB Basic Part: No; JLCPCB Part Number: C113842; Supplier 1: LCSC; Category: Capacitors - MLCC; Supplier Part Number 1: C113842; Tolerance: ±10%; Voltage Rating: 100V; Temperature Coefficient: X7R; RoHS: Yes; ComponentLink1Description: Datasheet; ComponentLink1URL: https://wmsc.lcsc.com/wmsc/upload/file/pdf/v2/lcsc/2304140030_YAGEO-CC0805KKX7R0BB683_C113842.pdf; ComponentLink2Description: JLCPCB Part URL; ComponentLink2URL: https://jlcpcb.com/partdetail/C113842; ComponentLink3Description: LCSC Part URL; ComponentLink3URL: https://lcsc.com/product-detail/Multilayer-Ceramic-Capacitors-MLCC---SMD-SMT_YAGEO-YAGEO-CC0805KKX7R0BB683_C113842.html
footprint CAP-0805 (0805 (2012M) Capacitor)
pins: 1, 2

## CC0805KKX7R5BB105
designator C?  Capacitance: 1uF  (hidden comment: *)
Capacitor, Ceramic (MLCC), 1uF, ±10%, 6.3V, X7R, ±10%, SMD 0805; Manufacturer: YAGEO; Manufacturer Part Number: CC0805KKX7R5BB105; Package Size: 0805; JLCPCB Basic Part: No; JLCPCB Part Number: C519972; Supplier 1: LCSC; Category: Capacitors - MLCC; Supplier Part Number 1: C519972; Tolerance: ±10%; Voltage Rating: 6.3V; Temperature Coefficient: X7R; RoHS: Yes; ComponentLink1Description: Datasheet; ComponentLink1URL: https://wmsc.lcsc.com/wmsc/upload/file/pdf/v2/lcsc/2007231534_YAGEO-CC0805KKX7R5BB105_C519972.pdf; ComponentLink2Description: JLCPCB Part URL; ComponentLink2URL: https://jlcpcb.com/partdetail/C519972; ComponentLink3Description: LCSC Part URL; ComponentLink3URL: https://lcsc.com/product-detail/Multilayer-Ceramic-Capacitors-MLCC---SMD-SMT_YAGEO-YAGEO-CC0805KKX7R5BB105_C519972.html
footprint CAP-0805 (0805 (2012M) Capacitor)
pins: 1, 2

## CC0805KKX7R5BB106
designator C?  Capacitance: 10uF  (hidden comment: *)
Capacitor, Ceramic (MLCC), 10uF, ±10%, 6.3V, X7R, ±10%, SMD 0805; Manufacturer: YAGEO; Manufacturer Part Number: CC0805KKX7R5BB106; Package Size: 0805; JLCPCB Basic Part: No; JLCPCB Part Number: C527225; Supplier 1: LCSC; Category: Capacitors - MLCC; Supplier Part Number 1: C527225; Tolerance: ±10%; Voltage Rating: 6.3V; Temperature Coefficient: X7R; RoHS: Yes; ComponentLink1Description: Datasheet; ComponentLink1URL: https://wmsc.lcsc.com/wmsc/upload/file/pdf/v2/lcsc/2006101835_YAGEO-CC0805KKX7R5BB106_C527225.pdf; ComponentLink2Description: JLCPCB Part URL; ComponentLink2URL: https://jlcpcb.com/partdetail/C527225; ComponentLink3Description: LCSC Part URL; ComponentLink3URL: https://lcsc.com/product-detail/Multilayer-Ceramic-Capacitors-MLCC---SMD-SMT_YAGEO-YAGEO-CC0805KKX7R5BB106_C527225.html
footprint CAP-0805 (0805 (2012M) Capacitor)
pins: 1, 2

## CC0805KKX7R5BB225
designator C?  Capacitance: 2.2uF  (hidden comment: *)
Capacitor, Ceramic (MLCC), 2.2uF, ±10%, 6.3V, X7R, ±10%, SMD 0805; Manufacturer: YAGEO; Manufacturer Part Number: CC0805KKX7R5BB225; Package Size: 0805; JLCPCB Basic Part: No; JLCPCB Part Number: C520034; Supplier 1: LCSC; Category: Capacitors - MLCC; Supplier Part Number 1: C520034; Tolerance: ±10%; Voltage Rating: 6.3V; Temperature Coefficient: X7R; RoHS: Yes; ComponentLink1Description: Datasheet; ComponentLink1URL: https://wmsc.lcsc.com/wmsc/upload/file/pdf/v2/lcsc/2006011836_YAGEO-CC0805KKX7R5BB225_C520034.pdf; ComponentLink2Description: JLCPCB Part URL; ComponentLink2URL: https://jlcpcb.com/partdetail/C520034; ComponentLink3Description: LCSC Part URL; ComponentLink3URL: https://lcsc.com/product-detail/Multilayer-Ceramic-Capacitors-MLCC---SMD-SMT_YAGEO-YAGEO-CC0805KKX7R5BB225_C520034.html
footprint CAP-0805 (0805 (2012M) Capacitor)
pins: 1, 2

## CC0805KKX7R5BB475
designator C?  Capacitance: 4.7uF  (hidden comment: *)
Capacitor, Ceramic (MLCC), 4.7uF, ±10%, 6.3V, X7R, ±10%, SMD 0805; Manufacturer: YAGEO; Manufacturer Part Number: CC0805KKX7R5BB475; Package Size: 0805; JLCPCB Basic Part: No; JLCPCB Part Number: C520073; Supplier 1: LCSC; Category: Capacitors - MLCC; Supplier Part Number 1: C520073; Tolerance: ±10%; Voltage Rating: 6.3V; Temperature Coefficient: X7R; RoHS: Yes; ComponentLink1Description: Datasheet; ComponentLink1URL: https://wmsc.lcsc.com/wmsc/upload/file/pdf/v2/lcsc/2005181835_YAGEO-CC0805KKX7R5BB475_C520073.pdf; ComponentLink2Description: JLCPCB Part URL; ComponentLink2URL: https://jlcpcb.com/partdetail/C520073; ComponentLink3Description: LCSC Part URL; ComponentLink3URL: https://lcsc.com/product-detail/Multilayer-Ceramic-Capacitors-MLCC---SMD-SMT_YAGEO-YAGEO-CC0805KKX7R5BB475_C520073.html
footprint CAP-0805 (0805 (2012M) Capacitor)
pins: 1, 2

## CC0805KKX7R6BB105
designator C?  Capacitance: 1uF  (hidden comment: *)
Capacitor, Ceramic (MLCC), 1uF, ±10%, 10V, X7R, ±10%, SMD 0805; Manufacturer: YAGEO; Manufacturer Part Number: CC0805KKX7R6BB105; Package Size: 0805; JLCPCB Basic Part: No; JLCPCB Part Number: C519973; Supplier 1: LCSC; Category: Capacitors - MLCC; Supplier Part Number 1: C519973; Tolerance: ±10%; Voltage Rating: 10V; Temperature Coefficient: X7R; RoHS: Yes; ComponentLink1Description: Datasheet; ComponentLink1URL: https://wmsc.lcsc.com/wmsc/upload/file/pdf/v2/lcsc/2007101233_YAGEO-CC0805KKX7R6BB105_C519973.pdf; ComponentLink2Description: JLCPCB Part URL; ComponentLink2URL: https://jlcpcb.com/partdetail/C519973; ComponentLink3Description: LCSC Part URL; ComponentLink3URL: https://lcsc.com/product-detail/Multilayer-Ceramic-Capacitors-MLCC---SMD-SMT_YAGEO-YAGEO-CC0805KKX7R6BB105_C519973.html
footprint CAP-0805 (0805 (2012M) Capacitor)
pins: 1, 2

## CC0805KKX7R6BB106
designator C?  Capacitance: 10uF  (hidden comment: *)
Capacitor, Ceramic (MLCC), 10uF, ±10%, 10V, X7R, ±10%, SMD 0805; Manufacturer: YAGEO; Manufacturer Part Number: CC0805KKX7R6BB106; Package Size: 0805; JLCPCB Basic Part: No; JLCPCB Part Number: C1952580; Supplier 1: LCSC; Category: Capacitors - MLCC; Supplier Part Number 1: C1952580; Tolerance: ±10%; Voltage Rating: 10V; Temperature Coefficient: X7R; RoHS: Yes; ComponentLink1Description: Datasheet; ComponentLink1URL: https://wmsc.lcsc.com/wmsc/upload/file/pdf/v2/lcsc/2201291000_YAGEO-CC0805KKX7R6BB106_C1952580.pdf; ComponentLink2Description: JLCPCB Part URL; ComponentLink2URL: https://jlcpcb.com/partdetail/C1952580; ComponentLink3Description: LCSC Part URL; ComponentLink3URL: https://lcsc.com/product-detail/Multilayer-Ceramic-Capacitors-MLCC---SMD-SMT_YAGEO-YAGEO-CC0805KKX7R6BB106_C1952580.html
footprint CAP-0805 (0805 (2012M) Capacitor)
pins: 1, 2

## CC0805KKX7R6BB225
designator C?  Capacitance: 2.2uF  (hidden comment: *)
Capacitor, Ceramic (MLCC), 2.2uF, ±10%, 10V, X7R, ±10%, SMD 0805; Manufacturer: YAGEO; Manufacturer Part Number: CC0805KKX7R6BB225; Package Size: 0805; JLCPCB Basic Part: No; JLCPCB Part Number: C107127; Supplier 1: LCSC; Category: Capacitors - MLCC; Supplier Part Number 1: C107127; Tolerance: ±10%; Voltage Rating: 10V; Temperature Coefficient: X7R; RoHS: Yes; ComponentLink1Description: Datasheet; ComponentLink1URL: https://wmsc.lcsc.com/wmsc/upload/file/pdf/v2/lcsc/2304140030_YAGEO-CC0805KKX7R6BB225_C107127.pdf; ComponentLink2Description: JLCPCB Part URL; ComponentLink2URL: https://jlcpcb.com/partdetail/C107127; ComponentLink3Description: LCSC Part URL; ComponentLink3URL: https://lcsc.com/product-detail/Multilayer-Ceramic-Capacitors-MLCC---SMD-SMT_YAGEO-YAGEO-CC0805KKX7R6BB225_C107127.html
footprint CAP-0805 (0805 (2012M) Capacitor)
pins: 1, 2

## CC0805KKX7R6BB334
designator C?  Capacitance: 330nF  (hidden comment: *)
Capacitor, Ceramic (MLCC), 330nF, ±10%, 10V, X7R, ±10%, SMD 0805; Manufacturer: YAGEO; Manufacturer Part Number: CC0805KKX7R6BB334; Package Size: 0805; JLCPCB Basic Part: No; JLCPCB Part Number: C519976; Supplier 1: LCSC; Category: Capacitors - MLCC; Supplier Part Number 1: C519976; Tolerance: ±10%; Voltage Rating: 10V; Temperature Coefficient: X7R; RoHS: Yes; ComponentLink1Description: Datasheet; ComponentLink1URL: https://wmsc.lcsc.com/wmsc/upload/file/pdf/v2/lcsc/2008051835_YAGEO-CC0805KKX7R6BB334_C519976.pdf; ComponentLink2Description: JLCPCB Part URL; ComponentLink2URL: https://jlcpcb.com/partdetail/C519976; ComponentLink3Description: LCSC Part URL; ComponentLink3URL: https://lcsc.com/product-detail/Multilayer-Ceramic-Capacitors-MLCC---SMD-SMT_YAGEO-YAGEO-CC0805KKX7R6BB334_C519976.html
footprint CAP-0805 (0805 (2012M) Capacitor)
pins: 1, 2
